# Altium footprint library AD_Lib.PcbLib: 508 footprints (part 32 of 32)
Each footprint in its own frame and in the unit in brackets; x right, y up, seen from the top. Pads: shape width x height; smd on the part's side, far side on the other; paste and mask are expansions set on the pad; w line width, h text height; cw(c..) or ccw(c..) is an arc to the next point about the centre after c.
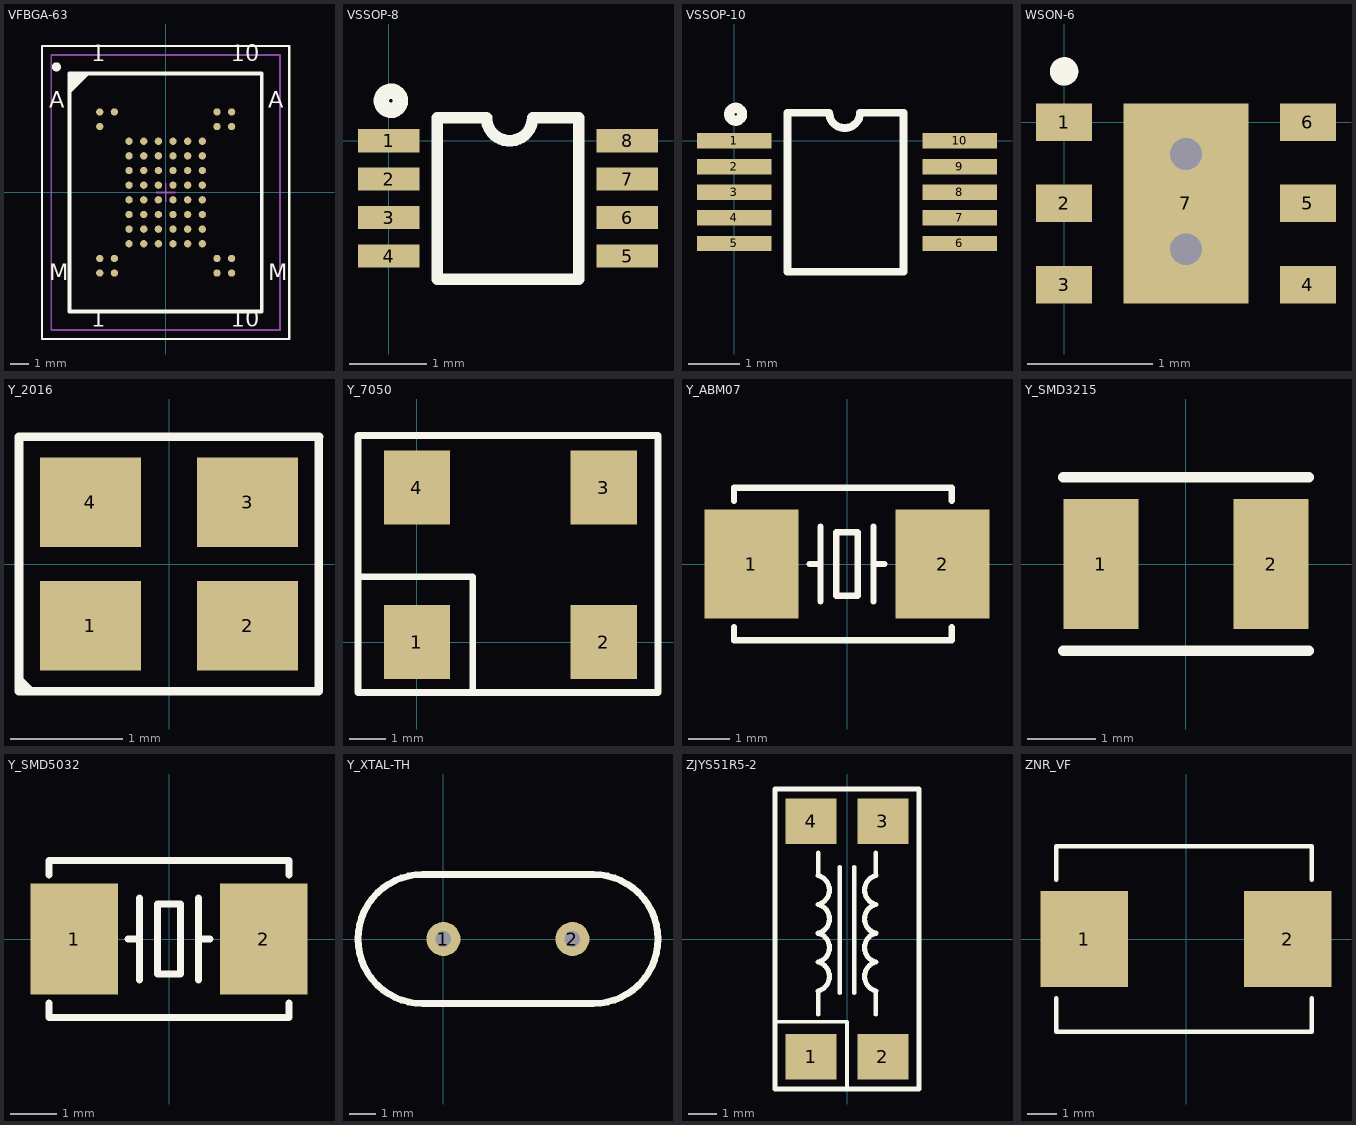
[diagram p31: the footprints below, top view; thin cyan lines are the x and y axes]

## VFBGA-63 [mm] "BGA, 63-Leads, Body 13.0x10.5mm,  Pitch 0.80mm"
height 0.82
pads (63):
  round 0.4 smd: A1(-3.6,4.4) A2(-2.8,4.4) A9(2.8,4.4) A10(3.6,4.4) B1(-3.6,3.6) B9(2.8,3.6) B10(3.6,3.6) C3(-2,2.8) C4(-1.2,2.8) C5(-0.4,2.8) C6(0.4,2.8) C7(1.2,2.8) C8(2,2.8) D3(-2,2) D4(-1.2,2) D5(-0.4,2) D6(0.4,2) D7(1.2,2) D8(2,2) E3(-2,1.2) E4(-1.2,1.2) E5(-0.4,1.2) E6(0.4,1.2) E7(1.2,1.2) E8(2,1.2) F3(-2,0.4) F4(-1.2,0.4) F5(-0.4,0.4) F6(0.4,0.4) F7(1.2,0.4) F8(2,0.4) G3(-2,-0.4) G4(-1.2,-0.4) G5(-0.4,-0.4) G6(0.4,-0.4) G7(1.2,-0.4) G8(2,-0.4) H3(-2,-1.2) H4(-1.2,-1.2) H5(-0.4,-1.2) H6(0.4,-1.2) H7(1.2,-1.2) H8(2,-1.2) J3(-2,-2) J4(-1.2,-2) J5(-0.4,-2) J6(0.4,-2) J7(1.2,-2) J8(2,-2) K3(-2,-2.8) K4(-1.2,-2.8) K5(-0.4,-2.8) K6(0.4,-2.8) K7(1.2,-2.8) K8(2,-2.8) L1(-3.6,-3.6) L2(-2.8,-3.6) L9(2.8,-3.6) L10(3.6,-3.6) M1(-3.6,-4.4) M2(-2.8,-4.4) M9(2.8,-4.4) M10(3.6,-4.4)
Top Overlay:
  circle w0.25: c-5.967,6.858 r0.125
  region: -4.25,6.5 -5.25,5.5 -5.25,6.5
  lines w0.127: -6.75,-8 -6.75,8 6.75,8 6.75,-8 -6.75,-8
  lines w0.2: -5.25,5.5 -4.25,6.5 ; -5.25,-6.5 5.25,-6.5 5.25,6.5 -5.25,6.5 -5.25,-6.5
  text "A" at -6.35,4.318 h1.52
  text "A" at 5.588,4.318 h1.52
  text "M" at 5.588,-5.08 h1.52
  text "M" at -6.35,-5.08 h1.52
  text "1" at -4.064,6.858 h1.52
  text "1" at -4.064,-7.62 h1.52
  text "10" at 3.556,-7.62 h1.52
  text "10" at 3.556,6.858 h1.52
Mechanical 13:
  lines w0.1: -5.25,-6.5 5.25,-6.5 5.25,6.5 -5.25,6.5 -5.25,-6.5
Mechanical 15:
  lines w0.1: -0.5,0 0.5,0 ; 0,-0.5 0,0.5 ; -6.25,-7.5 6.25,-7.5 6.25,7.5 -6.25,7.5 -6.25,-7.5
3D body: height 0.82, standoff 0.12, extent -5.25,-6.5 5.25,6.5

## VSSOP-8 [mm] "Shrink Small Outline; 8 Leads; Body Width 3 mm; Pitch 0.65 mm"
height 1.1
pads (8):
  rect 0.8x0.3 smd: 1(0,0) 2(0,-0.5) 3(0,-1) 4(0,-1.5) 5(3.1,-1.5) 6(3.1,-1) 7(3.1,-0.5) 8(3.1,0)
Top Overlay:
  circle w0.2: c0.028,0.52 r0.125
  lines w0.152: 0.63,-1.8 2.47,-1.8 2.47,0.3 1.87,0.3 cw(c1.57,0.3) 1.27,0.3 0.63,0.3 0.63,-1.8

## VSSOP-10 [mm] "Shrink Small Outline; 10 Leads; Body Width 3 mm; Pitch 0.5 mm"
height 1.1
pads (10):
  rect 1.45x0.3 smd: 1(0,0) 2(0,-0.5) 3(0,-1) 4(0,-1.5) 5(0,-2) 6(4.4,-2) 7(4.4,-1.5) 8(4.4,-1) 9(4.4,-0.5) 10(4.4,0)
Top Overlay:
  circle w0.2: c0.028,0.52 r0.125
  lines w0.152: 1.041,-2.55 3.302,-2.55 3.302,0.55 2.454,0.55 cw(c2.154,0.55) 1.854,0.55 1.041,0.55 1.041,-2.55

## WSON-6 [mm] "TI封装代码DRV"
height 0.8
pads (7):
  rect 0.45x0.3 smd: 1(0,0) 2(0,-0.65) 3(0,-1.3) 4(1.95,-1.3) 5(1.95,-0.65) 6(1.95,0)
  rect 1x1.6 smd: 7(0.975,-0.65)
via 0.975,-1.016 diameter 0.508 hole 0.254
via 0.975,-0.254 diameter 0.508 hole 0.254
Top Overlay:
  circle w0.127: c0,0.406 r0.05

## Y_2016 [mm] "4P有源晶振，2.0×1.6mm SMD"
height 0.8
pads (4):
  rect 0.9x0.8 smd: 1(-0.7,-0.55) 2(0.7,-0.55) 3(0.7,0.55) 4(-0.7,0.55)
Top Overlay:
  lines w0.076: -1.335,-0.787 -1.335,-1.134 -0.813,-1.134 ; -1.335,1.134 -1.335,-1.027 -1.228,-1.134 1.332,-1.134 1.332,1.134 ; -1.332,1.134 1.335,1.134

## Y_7050 [mm] "4P有源晶振，7.0×5.0mm SMD"
height 1.6
pads (4):
  rect 1.8x2 smd: 1(0,0) 2(5.08,0) 3(5.08,4.2) 4(0,4.2)
Top Overlay:
  lines w0.178: -1.6,1.778 1.524,1.778 1.524,-1.372
  lines w0.2: -1.6,-1.372 6.553,-1.372 6.553,5.613 -1.6,5.613 -1.6,-1.372

## Y_ABM07 [mm] "ABM7"
height 1.4
pads (2):
  rect 2.25x2.6 smd: 1(-2.286,0) 2(2.286,0)
Top Overlay:
  lines w0.152: -2.7,-1.512 -2.7,-1.827 2.5,-1.827 2.5,-1.512 ; -2.7,1.512 -2.7,1.827 2.5,1.827 2.5,1.512 ; -0.889,0 -0.635,0 ; -0.635,-0.889 -0.635,0.889 ; 0.635,-0.889 0.635,0.889 ; 0.635,0 0.889,0 ; -0.254,-0.762 0.254,-0.762 0.254,0.762 -0.254,0.762 -0.254,-0.762

## Y_SMD3215 [mm] "ABS07-32.768KHZ-9-T"
height 10.2
pads (2):
  rect 1.1x1.9 smd: 1(-1.25,0) 2(1.25,0)
Top Overlay:
  lines w0.152: -1.8,1.27 1.798,1.27 ; -1.798,-1.27 1.8,-1.27

## Y_SMD5032 [mm] "ABM3-40.000MHZ-D2Y-T，5032封装"
pads (2):
  rect 1.9x2.4 smd: 1(-2.05,0) 2(2.05,0)
Top Overlay:
  lines w0.152: -2.6,-1.385 -2.6,-1.7 2.6,-1.7 2.6,-1.385 ; -2.6,1.385 -2.6,1.7 2.6,1.7 2.6,1.385 ; -0.889,0 -0.635,0 ; -0.635,-0.889 -0.635,0.889 ; 0.635,-0.889 0.635,0.889 ; 0.635,0 0.889,0 ; -0.254,-0.762 -0.254,0.762 0.254,0.762 0.254,-0.762 -0.254,-0.762

## Y_XTAL-TH [mil] "无源晶振，直插"
height 43.31
pads (2):
  round 50 hole 23: 1(0,0) 2(189.76,0)
Top Overlay:
  lines w10: -30.63,-95 cw(c-30.63,0) -30.63,95 220.63,95 cw(c220.63,0) 220.63,-95 -30.63,-95

## ZJYS51R5-2 [mm] "ZJYS51?系列共模电感，TDK"
height 5.08
pads (4):
  rect 1.8x1.6 smd: 1(-1.27,-4.15) 2(1.27,-4.15) 3(1.27,4.15) 4(-1.27,4.15)
Top Overlay:
  lines w0.127: -2.54,-2.921 0,-2.921 0,-5.293
  lines w0.152: -1.016,-2.667 -1.016,-1.829 ; -1.016,2.235 -1.016,3.048 ; -0.254,-1.905 -0.254,2.54 ; 0.254,-1.905 0.254,2.54 ; 1.016,-2.667 1.016,-1.829 ; 1.016,2.235 1.016,3.048
  lines w0.178: -1.016,-1.829 ccw(c-1.143,-1.321) -1.016,-0.813 ccw(c-1.143,-0.305) -1.016,0.203 ccw(c-1.143,0.711) -1.016,1.219 ccw(c-1.143,1.727) -1.016,2.235 ; 1.016,-1.829 cw(c1.143,-1.321) 1.016,-0.813 cw(c1.143,-0.305) 1.016,0.203 cw(c1.143,0.711) 1.016,1.219 cw(c1.143,1.727) 1.016,2.235 ; -2.54,-5.293 2.54,-5.293 2.54,5.293 -2.54,5.293 -2.54,-5.293

## ZNR_VF [mm] "Panasonic VF系列压敏电阻"
height 3.5
pads (2):
  rect 3x3.3 smd: 1(-3.492,0) 2(3.492,0)
Top Overlay:
  lines w0.152: -4.445,-2.032 -4.445,-3.175 4.318,-3.175 4.318,-2.032 ; -4.445,2.032 -4.445,3.175 4.318,3.175 4.318,2.032